# Altium footprint library cool_library.PcbLib: 1182 footprints (part 24 of 75)
Each footprint in its own frame and in the unit in brackets; x right, y up, seen from the top. Pads: shape width x height; smd on the part's side, far side on the other; paste and mask are expansions set on the pad; w line width, h text height; cw(c..) or ccw(c..) is an arc to the next point about the centre after c.
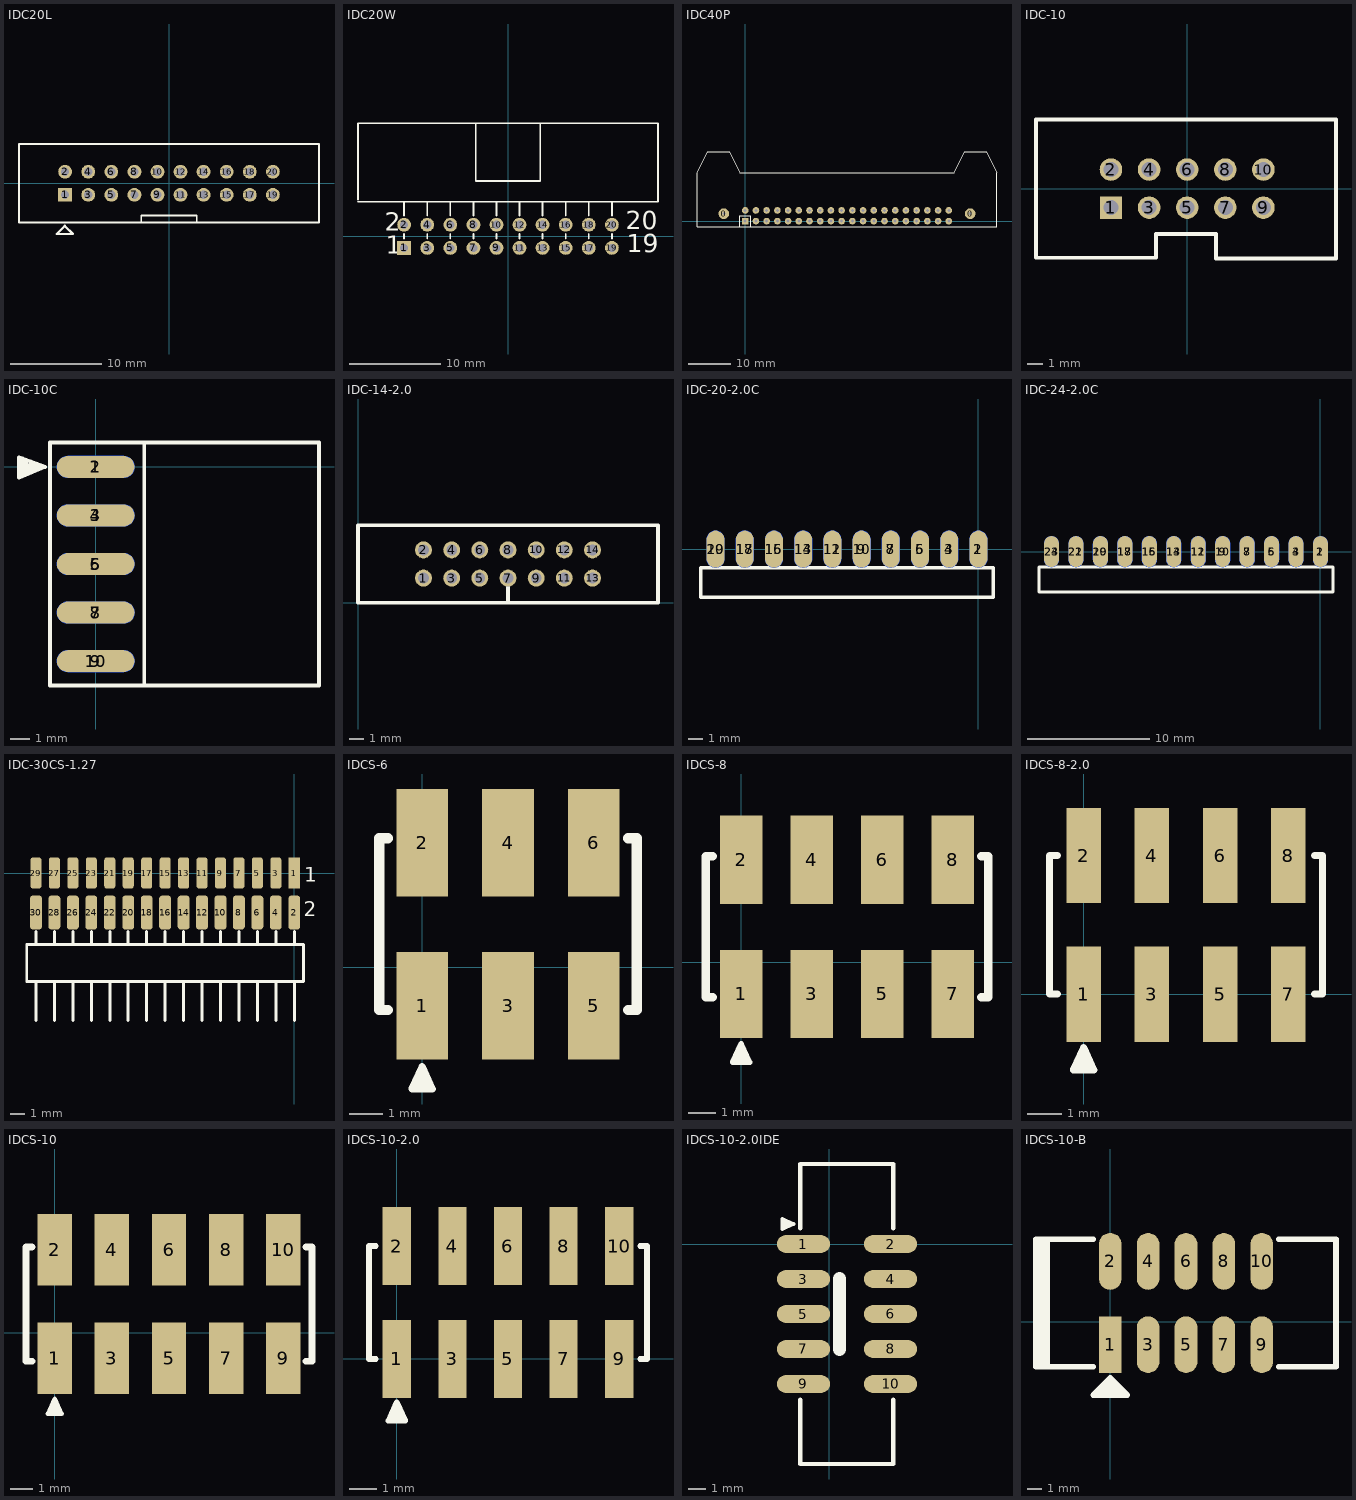
[diagram p23: the footprints below, top view; thin cyan lines are the x and y axes]

## IDC20L [mil]
pads (20):
  rect 60x60 hole 35.43: 1(-450,-50)
  round 60 hole 35.43: 2(-450,50) 3(-350,-50) 4(-350,50) 5(-250,-50) 6(-250,50) 7(-150,-50) 8(-150,50) 9(-50,-50) 10(-50,50) 11(50,-50) 12(50,50) 13(150,-50) 14(150,50) 15(250,-50) 16(250,50) 17(350,-50) 18(350,50) 19(450,-50) 20(450,50)
Top Overlay:
  lines w8: -120,-170 -120,-140 120,-140 120,-170 ; -650,-170 650,-170 650,170 -650,170 -650,0 -650,-170
  lines w10: -486.4,-219.53 -416.4,-219.53 -451.4,-184.53 -486.4,-219.53

## IDC20W [mil]
pads (20):
  rect 60x60 hole 35.43: 1(-450,-50)
  round 60 hole 35.43: 2(-450,50) 3(-350,-50) 4(-350,50) 5(-250,-50) 6(-250,50) 7(-150,-50) 8(-150,50) 9(-50,-50) 10(-50,50) 11(50,-50) 12(50,50) 13(150,-50) 14(150,50) 15(250,-50) 16(250,50) 17(350,-50) 18(350,50) 19(450,-50) 20(450,50)
Top Overlay:
  lines w8: -650,150 650,150 650,490 -650,490 -650,280 ; -650,160 -650,290 ; -450,-10 -450,10 ; -450,90 -450,150 ; -350,-10 -350,10 ; -350,90 -350,150 ; -250,-10 -250,10 ; -250,90 -250,150 ; -150,-10 -150,10 ; -150,90 -150,150 ; -140,490 -140,240 140,240 140,490 ; -50,-10 -50,10 ; -50,90 -50,140 -50,150 ; 50,-10 50,10 ; 50,90 50,150 ; 150,-10 150,10 ; 150,90 150,150 ; 250,-10 250,10 ; 250,90 250,150 ; 350,-10 350,10 ; 350,90 350,150 ; 450,-10 450,10 ; 450,90 450,150
  text "1" at -530,-75 h78.74
  text "2" at -535,25 h78.74
  text "20" at 510,30 h78.74
  text "19" at 515,-70 h78.74

## IDC40P [mil]
pads (42):
  round 100 hole 28: 0(-200,70) 0(2100,70)
  rect 62x62 hole 28: 1(0,0)
  round 62 hole 28: 2(0,100) 3(100,0) 4(100,100) 5(200,0) 6(200,100) 7(300,0) 8(300,100) 9(400,0) 10(400,100) 11(500,0) 12(500,100) 13(600,0) 14(600,100) 15(700,0) 16(700,100) 17(800,0) 18(800,100) 19(900,0) 20(900,100) 21(1000,0) 22(1000,100) 23(1100,0) 24(1100,100) 25(1200,0) 26(1200,100) 27(1300,0) 28(1300,100) 29(1400,0) 30(1400,100) 31(1500,0) 32(1500,100) 33(1600,0) 34(1600,100) 35(1700,0) 36(1700,100) 37(1800,0) 38(1800,100) 39(1900,0) 40(1900,100)
Top Overlay:
  lines w8: -50,-50 -50,50 50,50 50,-50 ; -450,-50 2350,-50 2350,450 2250,650 2050,650 1950,450 -50,450 -150,650 -350,650 -450,450 -450,-50

## IDC-10 [mm]
pads (10):
  rect 1.499x1.499 hole 1: 1(-5.08,-1.27)
  round 1.5 hole 1: 2(-5.08,1.27) 3(-2.54,-1.27) 4(-2.54,1.27) 5(0,-1.27) 6(0,1.27) 7(2.54,-1.27) 8(2.54,1.27) 9(5.08,-1.27) 10(5.08,1.27)
Top Overlay:
  lines w0.254: -10.08,-4.612 -10.08,4.598 9.92,4.598 9.92,-4.652 1.92,-4.652 1.92,-3.017 -2.08,-3.017 -2.08,-4.612 -10.08,-4.612

## IDC-10C [mil]
pads (10):
  oval 160x45 smd: 1(0,0) 3(0,-100) 5(0,-200) 7(0,-300) 9(0,-400)
  oval 160x45 smd far side: 2(0,0) 4(0,-100) 6(0,-200) 8(0,-300) 10(0,-400)
Top Overlay:
  lines w8: -116,4 -123,-6 -126,6 -133,-10 -134,11 -142,-13 -143,11 -151,-17 -151,17 -158,17 -158,20 ; 100,-450 100,50 ; -158,20 -158,-22 -104,0 -158,20 ; -94,-450 -94,50 460,50 460,-450 -94,-450

## IDC-14-2.0 [mm]
pads (14):
  round 1.2 hole 0.762: 1(4.65,1.75) 2(4.65,3.75) 3(6.65,1.75) 4(6.65,3.75) 5(8.65,1.75) 6(8.65,3.75) 7(10.65,1.75) 8(10.65,3.75) 9(12.65,1.75) 10(12.65,3.75) 11(14.65,1.75) 12(14.65,3.75) 13(16.65,1.75) 14(16.65,3.75)
Top Overlay:
  lines w0.254: 10.65,0 10.65,1.27 ; 0,0 0,5.5 21.3,5.5 21.3,0 0,0

## IDC-20-2.0C [mil]
pads (20):
  oval 48x100 smd: 1(0,0) 3(-78.74,0) 5(-157.48,0) 7(-236.22,0) 9(-314.96,0) 11(-393.7,0) 13(-472.44,0) 15(-551.18,0) 17(-629.92,0) 19(-708.66,0)
  oval 48x100 smd far side: 2(0,0) 4(-78.74,0) 6(-157.48,0) 8(-236.22,0) 10(-314.96,0) 12(-393.7,0) 14(-472.44,0) 16(-551.18,0) 18(-629.92,0) 20(-708.66,0)
Top Overlay:
  lines w10: -748.66,-130 -748.66,-50 40,-50 40,-130 -748.66,-130

## IDC-24-2.0C [mil]
pads (24):
  oval 48x100 smd: 1(0,0) 3(-78.74,0) 5(-157.48,0) 7(-236.22,0) 9(-314.96,0) 11(-393.7,0) 13(-472.44,0) 15(-551.18,0) 17(-629.92,0) 19(-708.66,0) 21(-787.4,0) 23(-866.14,0)
  oval 48x100 smd far side: 2(0,0) 4(-78.74,0) 6(-157.48,0) 8(-236.22,0) 10(-314.96,0) 12(-393.7,0) 14(-472.44,0) 16(-551.18,0) 18(-629.92,0) 20(-708.66,0) 22(-787.4,0) 24(-866.14,0)
Top Overlay:
  lines w10: -906.14,-130 -906.14,-50 40,-50 40,-130 -906.14,-130

## IDC-30CS-1.27 [mil]
height 120
pads (30):
  rect 30x85 smd: 1(0,0)
  rrect50% 32x92 smd: 2(0,-107) 4(-50,-107) 6(-100,-107) 8(-150,-107) 10(-200,-107) 12(-250,-107) 14(-300,-107) 16(-350,-107) 18(-400,-107) 20(-450,-107) 22(-500,-107) 24(-550,-107) 26(-600,-107) 28(-650,-107) 30(-700,-107)
  rrect50% 30x85 smd: 3(-50,0) 5(-100,0) 7(-150,0) 9(-200,0) 11(-250,0) 13(-300,0) 15(-350,0) 17(-400,0) 19(-450,0) 21(-500,0) 23(-550,0) 25(-600,0) 27(-650,0) 29(-700,0)
Top Overlay:
  lines w8: -700,-400 -700,-294 ; -700,-194 -700,-159 ; -650,-400 -650,-294 ; -650,-194 -650,-159 ; -600,-400 -600,-294 ; -600,-194 -600,-159 ; -550,-400 -550,-294 ; -550,-194 -550,-159 ; -500,-400 -500,-294 ; -500,-194 -500,-159 ; -450,-400 -450,-294 ; -450,-194 -450,-159 ; -400,-400 -400,-294 ; -400,-194 -400,-159 ; -350,-400 -350,-294 ; -350,-194 -350,-159 ; -300,-400 -300,-294 ; -300,-194 -300,-159 ; -250,-400 -250,-294 ; -250,-194 -250,-159 ; -200,-400 -200,-294 ; -200,-194 -200,-159 ; -150,-400 -150,-294 ; -150,-194 -150,-159 ; -100,-400 -100,-294 ; -100,-194 -100,-159 ; -50,-400 -50,-294 ; -50,-194 -50,-159 ; 0,-400 0,-294 ; 0,-194 0,-159 ; -725,-294 -725,-194 25,-194 25,-294 -725,-294
  text "2" at 26,-117 h40
  text "1" at 27,-24 h40

## IDCS-6 [mil]
pads (6):
  rect 60x125 smd: 1(0,-45) 2(0,145) 3(100,-45) 4(100,145) 5(200,-45) 6(200,145)
Top Overlay:
  lines w8: -12,-142 12,-142 0,-116 -12,-142
  lines w12: -40,-50 -50,-50 -50,150 -40,150 ; 0,-140 0,-125 ; 240,-50 250,-50 250,150 240,150

## IDCS-8 [mil]
pads (8):
  rect 60x125 smd: 1(0,-45) 2(0,145) 3(100,-45) 4(100,145) 5(200,-45) 6(200,145) 7(300,-45) 8(300,145)
Top Overlay:
  lines w8: -12,-142 12,-142 0,-116 -12,-142
  lines w12: -40,-50 -50,-50 -50,150 -40,150 ; 0,-140 0,-125 ; 340,-50 350,-50 350,150 340,150

## IDCS-8-2.0 [mil]
pads (8):
  rect 40x110 smd: 1(0,0) 2(0,160) 3(78.74,0) 4(78.74,160) 5(157.48,0) 6(157.48,160) 7(236.22,0) 8(236.22,160)
Top Overlay:
  lines w8: -30,0 -39.37,0 -39.37,160 -30,160 ; 266.22,0 275.59,0 275.59,160 266.22,160 ; -12,-87.63 0,-61.63 12,-87.63 -12,-87.63
  lines w12: 0,-85.63 0,-70.63

## IDCS-10 [mil]
pads (10):
  rect 60x125 smd: 1(0,-45) 2(0,145) 3(100,-45) 4(100,145) 5(200,-45) 6(200,145) 7(300,-45) 8(300,145) 9(400,-45) 10(400,145)
Top Overlay:
  lines w8: -12,-142 12,-142 0,-116 -12,-142
  lines w12: -40,-50 -50,-50 -50,150 -40,150 ; 0,-140 0,-125 ; 440,-50 450,-50 450,150 440,150

## IDCS-10-2.0 [mil]
pads (10):
  rect 40x110 smd: 1(0,0) 2(0,160) 3(78.74,0) 4(78.74,160) 5(157.48,0) 6(157.48,160) 7(236.22,0) 8(236.22,160) 9(314.96,0) 10(314.96,160)
Top Overlay:
  lines w8: -30,0 -39.37,0 -39.37,160 -30,160 ; 344.96,0 354.33,0 354.33,160 344.96,160 ; -12,-87.63 0,-61.63 12,-87.63 -12,-87.63
  lines w12: 0,-85.63 0,-70.63

## IDCS-10-2.0IDE [mil]
pads (10):
  oval 120x40 smd: 1(-58,0) 2(138,0) 3(-58,-78.74) 4(138,-78.74) 5(-58,-157.48) 6(138,-157.48) 7(-58,-236.22) 8(138,-236.22) 9(-58,-314.96) 10(138,-314.96)
Top Overlay:
  lines w8: -106,33 -80,45 -106,57 -106,33
  lines w10: -65.63,-349.96 -65.63,-494.96 144.37,-494.96 144.37,-349.96 ; -65.63,35 -65.63,180 144.37,180 144.37,35
  lines w12: -104,45 -89,45
  lines w30: 23,-236.66 23,-78

## IDCS-10-B [mil]
pads (10):
  rect 60x150 smd: 1(0,-60)
  oval 60x150 smd: 2(0,160) 3(100,-60) 4(100,160) 5(200,-60) 6(200,160) 7(300,-60) 8(300,160) 9(400,-60) 10(400,160)
Top Overlay:
  lines w8: -12,-160 12,-160
  lines w15: -181,-118 -181,218 ; -167,-118 -167,218 ; -45,-118 -196,-118 -196,218 -45,218 ; -30.76,-182.24 -20,-193 ; -22.85,-175.15 -5,-193 ; -16.42,-166.58 10,-193 ; -5.68,-157.32 30,-193 ; 445,-118 596,-118 596,218 445,218 ; -45,-193 45,-193 0,-148 -45,-193